# Altium footprint library JDR2812（公开）.PcbLib: 142 footprints (part 1 of 9)
Each footprint in its own frame and in the unit in brackets; x right, y up, seen from the top. Pads: shape width x height; smd on the part's side, far side on the other; paste and mask are expansions set on the pad; w line width, h text height; cw(c..) or ccw(c..) is an arc to the next point about the centre after c.
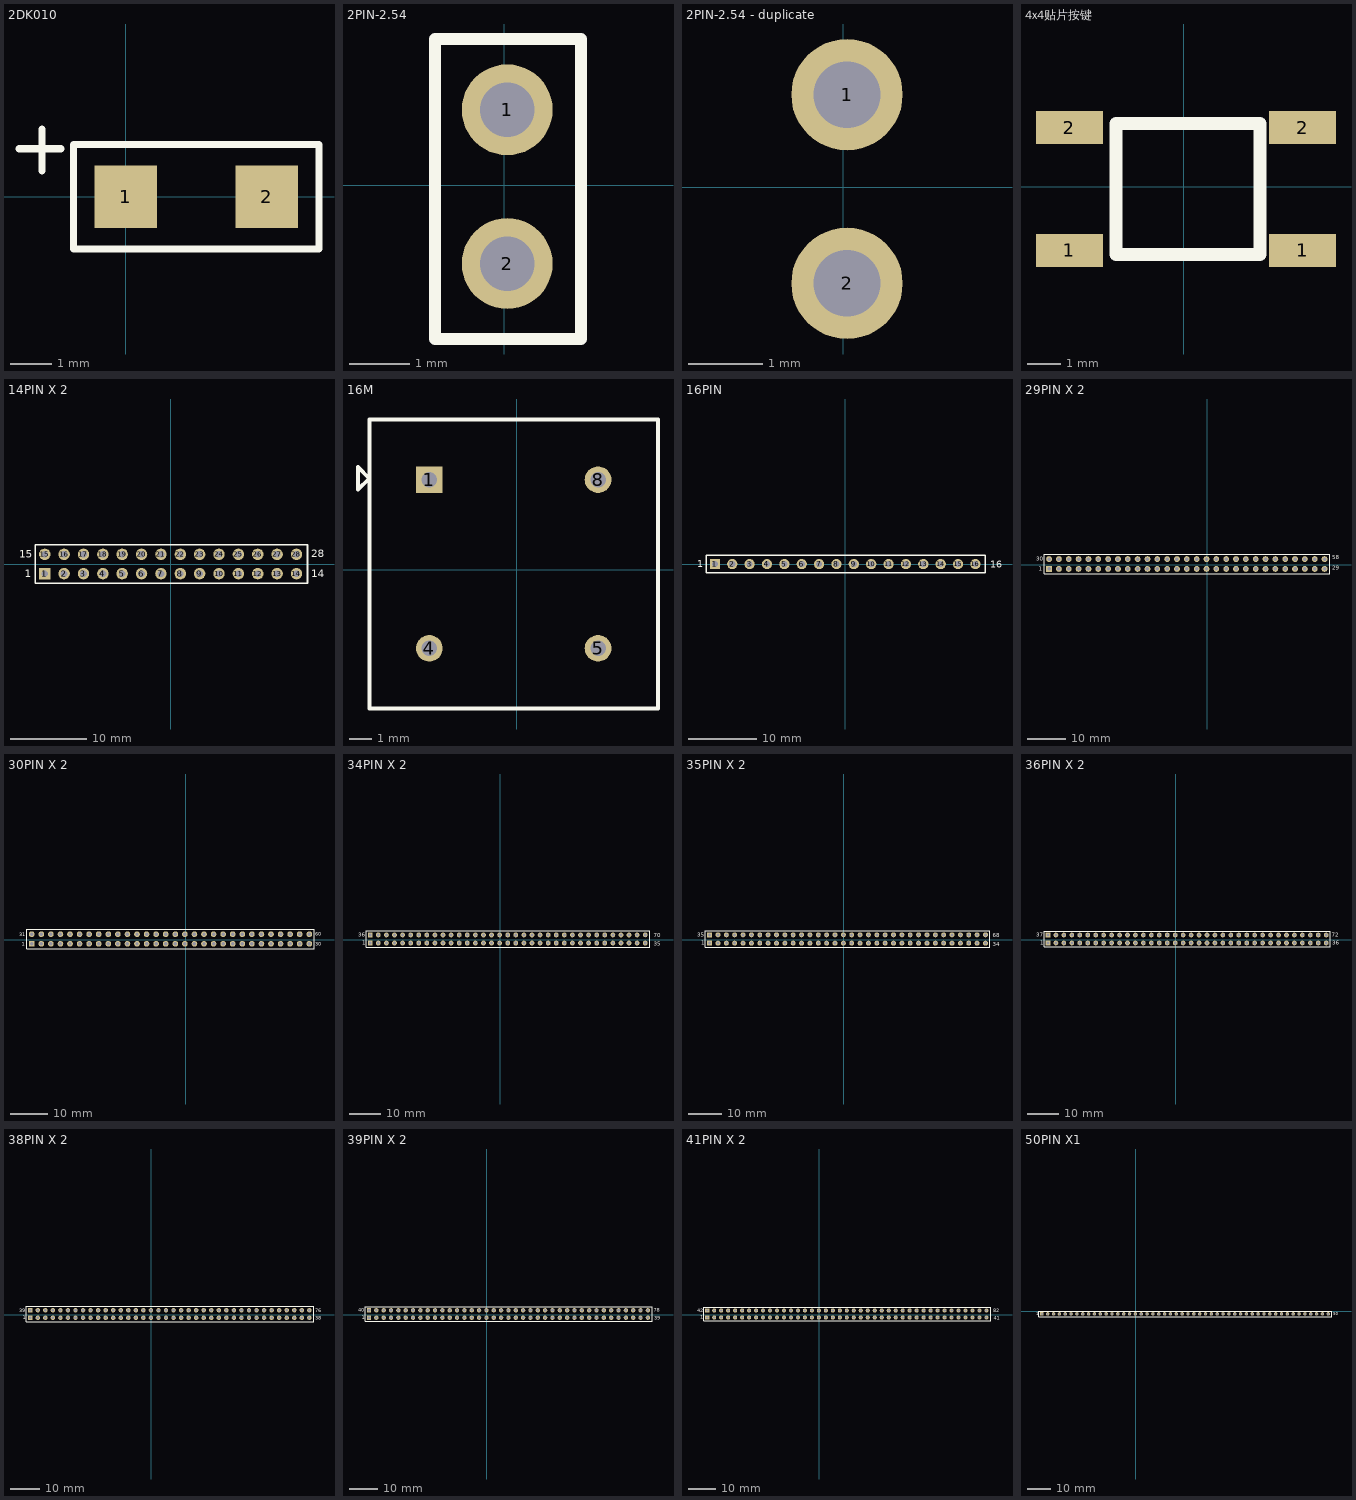
[diagram p0: the footprints below, top view; thin cyan lines are the x and y axes]

## 2DK010 [mil]
height 68.9
pads (2):
  rect 60x60 smd: 1(0,0) 2(135,0)
Top Overlay:
  lines w7: -102.12,45.83 -62.12,45.83 ; -80.12,24.83 -80.12,64.83 ; -50,-50 -50,50 185,50 185,-50 -50,-50

## 2PIN-2.54 [mm]
pads (2):
  round 1.5 hole 0.9: 1(0.051,1.245) 2(0.051,-1.295)
Top Overlay:
  lines w0.203: -1.143,-2.54 1.27,-2.54 1.27,2.413 -1.143,2.413 -1.143,-2.54

## 2PIN-2.54 - duplicate [mm]
pads (2):
  round 1.5 hole 0.9: 1(0.051,1.245) 2(0.051,-1.295)

## 4x4贴片按键 [mm]
pads (4):
  rect 2x1 smd: 1(-3.429,-1.905) 1(3.556,-1.905) 2(-3.429,1.778) 2(3.556,1.778)
Top Overlay:
  lines w0.39: -2.032,-2.032 2.286,-2.032 2.286,1.905 -2.032,1.905 -2.032,-2.032

## 14PIN X 2 [mm]
pads (28):
  rect 1.5x1.5 hole 0.9: 1(-16.51,-1.27)
  round 1.5 hole 0.9: 2(-13.97,-1.27) 3(-11.43,-1.27) 4(-8.89,-1.27) 5(-6.35,-1.27) 6(-3.81,-1.27) 7(-1.27,-1.27) 8(1.27,-1.27) 9(3.81,-1.27) 10(6.35,-1.27) 11(8.89,-1.27) 12(11.43,-1.27) 13(13.97,-1.27) 14(16.51,-1.27) 15(-16.51,1.27) 16(-13.97,1.27) 17(-11.43,1.27) 18(-8.89,1.27) 19(-6.35,1.27) 20(-3.81,1.27) 21(-1.27,1.27) 22(1.27,1.27) 23(3.81,1.27) 24(6.35,1.27) 25(8.89,1.27) 26(11.43,1.27) 27(13.97,1.27) 28(16.51,1.27)
Top Overlay:
  lines w0.2: -17.78,-2.54 17.958,-2.54 17.958,2.54 -17.78,2.54 -17.78,-2.54
  text "14" at 18.466,-1.753 h1
  text "28" at 18.466,0.914 h1
  text "15" at -19.888,0.787 h1
  text "1" at -19.126,-1.753 h1

## 16M [mm]
height 1.75
pads (4):
  rect 1.2x1.2 hole 0.7: 1(-3.927,4.054)
  round 1.2 hole 0.7: 4(-3.927,-3.546) 5(3.673,-3.546) 8(3.673,4.054)
Top Overlay:
  lines w0.178: -7.142,3.605 -7.142,4.621 -6.634,4.113 -7.142,3.605 ; -6.627,-6.246 -6.627,6.754 6.373,6.754 6.373,-6.246 -6.627,-6.246

## 16PIN [mm]
pads (16):
  rect 1.5x1.5 hole 0.9: 1(-19.05,0)
  round 1.5 hole 0.9: 2(-16.51,0) 3(-13.97,0) 4(-11.43,0) 5(-8.89,0) 6(-6.35,0) 7(-3.81,0) 8(-1.27,0) 9(1.27,0) 10(3.81,0) 11(6.35,0) 12(8.89,0) 13(11.43,0) 14(13.97,0) 15(16.51,0) 16(19.05,0)
Top Overlay:
  lines w0.2: -20.32,-1.27 -20.32,1.295 20.498,1.295 20.498,-1.27 -20.32,-1.27
  text "1" at -21.666,-0.483 h1
  text "16" at 21.209,-0.508 h1

## 29PIN X 2 [mm]
pads (58):
  rect 1.5x1.5 hole 0.9: 1(-40.818,-1.041)
  round 1.5 hole 0.9: 2(-38.278,-1.041) 3(-35.738,-1.041) 4(-33.198,-1.041) 5(-30.658,-1.041) 6(-28.118,-1.041) 7(-25.578,-1.041) 8(-23.038,-1.041) 9(-20.498,-1.041) 10(-17.958,-1.041) 11(-15.418,-1.041) 12(-12.878,-1.041) 13(-10.338,-1.041) 14(-7.798,-1.041) 15(-5.258,-1.041) 16(-2.718,-1.041) 17(-0.178,-1.041) 18(2.362,-1.041) 19(4.902,-1.041) 20(7.442,-1.041) 21(9.982,-1.041) 22(12.522,-1.041) 23(15.062,-1.041) 24(17.602,-1.041) 25(20.142,-1.041) 26(22.682,-1.041) 27(25.222,-1.041) 28(27.762,-1.041) 29(30.302,-1.041) 30(-40.818,1.499) 31(-38.278,1.499) 32(-35.738,1.499) 33(-33.198,1.499) 34(-30.658,1.499) 35(-28.118,1.499) 36(-25.578,1.499) 37(-23.038,1.499) 38(-20.498,1.499) 39(-17.958,1.499) 40(-15.418,1.499) 41(-12.878,1.499) 42(-10.338,1.499) 43(-7.798,1.499) 44(-5.258,1.499) 45(-2.718,1.499) 46(-0.178,1.499) 47(2.362,1.499) 48(4.902,1.499) 49(7.442,1.499) 50(9.982,1.499) 51(12.522,1.499) 52(15.062,1.499) 53(17.602,1.499) 54(20.142,1.499) 55(22.682,1.499) 56(25.222,1.499) 57(27.762,1.499) 58(30.302,1.499)
Top Overlay:
  lines w0.2: -42.088,-2.311 31.623,-2.311 31.623,2.769 -42.088,2.769 -42.088,-2.311
  text "29" at 32.258,-1.27 h1
  text "58" at 32.258,1.397 h1
  text "30" at -44.196,1.016 h1
  text "1" at -43.434,-1.524 h1

## 30PIN X 2 [mm]
pads (60):
  rect 1.5x1.5 hole 0.9: 1(-40.818,-1.041)
  round 1.5 hole 0.9: 2(-38.278,-1.041) 3(-35.738,-1.041) 4(-33.198,-1.041) 5(-30.658,-1.041) 6(-28.118,-1.041) 7(-25.578,-1.041) 8(-23.038,-1.041) 9(-20.498,-1.041) 10(-17.958,-1.041) 11(-15.418,-1.041) 12(-12.878,-1.041) 13(-10.338,-1.041) 14(-7.798,-1.041) 15(-5.258,-1.041) 16(-2.718,-1.041) 17(-0.178,-1.041) 18(2.362,-1.041) 19(4.902,-1.041) 20(7.442,-1.041) 21(9.982,-1.041) 22(12.522,-1.041) 23(15.062,-1.041) 24(17.602,-1.041) 25(20.142,-1.041) 26(22.682,-1.041) 27(25.222,-1.041) 28(27.762,-1.041) 29(30.302,-1.041) 30(32.842,-1.041) 31(-40.818,1.499) 32(-38.278,1.499) 33(-35.738,1.499) 34(-33.198,1.499) 35(-30.658,1.499) 36(-28.118,1.499) 37(-25.578,1.499) 38(-23.038,1.499) 39(-20.498,1.499) 40(-17.958,1.499) 41(-15.418,1.499) 42(-12.878,1.499) 43(-10.338,1.499) 44(-7.798,1.499) 45(-5.258,1.499) 46(-2.718,1.499) 47(-0.178,1.499) 48(2.362,1.499) 49(4.902,1.499) 50(7.442,1.499) 51(9.982,1.499) 52(12.522,1.499) 53(15.062,1.499) 54(17.602,1.499) 55(20.142,1.499) 56(22.682,1.499) 57(25.222,1.499) 58(27.762,1.499) 59(30.302,1.499) 60(32.842,1.499)
Top Overlay:
  lines w0.2: -42.088,-2.311 -42.088,2.769 34.163,2.769 34.163,-2.311 -42.088,-2.311
  text "1" at -43.434,-1.524 h1
  text "31" at -44.196,1.016 h1
  text "60" at 34.417,1.143 h1
  text "30" at 34.417,-1.524 h1

## 34PIN X 2 [mm]
pads (70):
  rect 1.5x1.5 hole 0.9: 1(-40.818,-1.041) 36(-40.818,1.499)
  round 1.5 hole 0.9: 2(-38.278,-1.041) 3(-35.738,-1.041) 4(-33.198,-1.041) 5(-30.658,-1.041) 6(-28.118,-1.041) 7(-25.578,-1.041) 8(-23.038,-1.041) 9(-20.498,-1.041) 10(-17.958,-1.041) 11(-15.418,-1.041) 12(-12.878,-1.041) 13(-10.338,-1.041) 14(-7.798,-1.041) 15(-5.258,-1.041) 16(-2.718,-1.041) 17(-0.178,-1.041) 18(2.362,-1.041) 19(4.902,-1.041) 20(7.442,-1.041) 21(9.982,-1.041) 22(12.522,-1.041) 23(15.062,-1.041) 24(17.602,-1.041) 25(20.142,-1.041) 26(22.682,-1.041) 27(25.222,-1.041) 28(27.762,-1.041) 29(30.302,-1.041) 30(32.842,-1.041) 31(35.382,-1.041) 32(37.922,-1.041) 33(40.462,-1.041) 34(43.002,-1.041) 35(45.568,-1.041) 37(-38.278,1.499) 38(-35.738,1.499) 39(-33.198,1.499) 40(-30.658,1.499) 41(-28.118,1.499) 42(-25.578,1.499) 43(-23.038,1.499) 44(-20.498,1.499) 45(-17.958,1.499) 46(-15.418,1.499) 47(-12.878,1.499) 48(-10.338,1.499) 49(-7.798,1.499) 50(-5.258,1.499) 51(-2.718,1.499) 52(-0.178,1.499) 53(2.362,1.499) 54(4.902,1.499) 55(7.442,1.499) 56(9.982,1.499) 57(12.522,1.499) 58(15.062,1.499) 59(17.602,1.499) 60(20.142,1.499) 61(22.682,1.499) 62(25.222,1.499) 63(27.762,1.499) 64(30.302,1.499) 65(32.842,1.499) 66(35.382,1.499) 67(37.922,1.499) 68(40.462,1.499) 69(43.002,1.499) 70(45.542,1.524)
Top Overlay:
  lines w0.2: -42.088,-2.311 -42.088,2.769 46.888,2.769 46.888,-2.311 -42.088,-2.311
  text "36" at -44.653,0.889 h1.27
  text "1" at -43.358,-1.549 h1.27
  text "70" at 48.235,0.762 h1.27
  text "35" at 48.285,-1.905 h1.27

## 35PIN X 2 [mm]
pads (68):
  rect 1.5x1.5 hole 0.9: 1(-40.818,-1.041) 35(-40.818,1.499)
  round 1.5 hole 0.9: 2(-38.278,-1.041) 3(-35.738,-1.041) 4(-33.198,-1.041) 5(-30.658,-1.041) 6(-28.118,-1.041) 7(-25.578,-1.041) 8(-23.038,-1.041) 9(-20.498,-1.041) 10(-17.958,-1.041) 11(-15.418,-1.041) 12(-12.878,-1.041) 13(-10.338,-1.041) 14(-7.798,-1.041) 15(-5.258,-1.041) 16(-2.718,-1.041) 17(-0.178,-1.041) 18(2.362,-1.041) 19(4.902,-1.041) 20(7.442,-1.041) 21(9.982,-1.041) 22(12.522,-1.041) 23(15.062,-1.041) 24(17.602,-1.041) 25(20.142,-1.041) 26(22.682,-1.041) 27(25.222,-1.041) 28(27.762,-1.041) 29(30.302,-1.041) 30(32.842,-1.041) 31(35.382,-1.041) 32(37.922,-1.041) 33(40.462,-1.041) 34(43.002,-1.041) 36(-38.278,1.499) 37(-35.738,1.499) 38(-33.198,1.499) 39(-30.658,1.499) 40(-28.118,1.499) 41(-25.578,1.499) 42(-23.038,1.499) 43(-20.498,1.499) 44(-17.958,1.499) 45(-15.418,1.499) 46(-12.878,1.499) 47(-10.338,1.499) 48(-7.798,1.499) 49(-5.258,1.499) 50(-2.718,1.499) 51(-0.178,1.499) 52(2.362,1.499) 53(4.902,1.499) 54(7.442,1.499) 55(9.982,1.499) 56(12.522,1.499) 57(15.062,1.499) 58(17.602,1.499) 59(20.142,1.499) 60(22.682,1.499) 61(25.222,1.499) 62(27.762,1.499) 63(30.302,1.499) 64(32.842,1.499) 65(35.382,1.499) 66(37.922,1.499) 67(40.462,1.499) 68(43.002,1.499)
Top Overlay:
  lines w0.2: -42.088,-2.311 -42.088,2.769 44.348,2.769 44.348,-2.311 -42.088,-2.311
  text "35" at -44.653,0.889 h1.27
  text "1" at -43.358,-1.549 h1.27
  text "68" at 45.187,0.762 h1.27
  text "34" at 45.237,-1.905 h1.27

## 36PIN X 2 [mm]
pads (72):
  rect 1.5x1.5 hole 0.9: 1(-40.818,-1.041) 37(-40.818,1.499)
  round 1.5 hole 0.9: 2(-38.278,-1.041) 3(-35.738,-1.041) 4(-33.198,-1.041) 5(-30.658,-1.041) 6(-28.118,-1.041) 7(-25.578,-1.041) 8(-23.038,-1.041) 9(-20.498,-1.041) 10(-17.958,-1.041) 11(-15.418,-1.041) 12(-12.878,-1.041) 13(-10.338,-1.041) 14(-7.798,-1.041) 15(-5.258,-1.041) 16(-2.718,-1.041) 17(-0.178,-1.041) 18(2.362,-1.041) 19(4.902,-1.041) 20(7.442,-1.041) 21(9.982,-1.041) 22(12.522,-1.041) 23(15.062,-1.041) 24(17.602,-1.041) 25(20.142,-1.041) 26(22.682,-1.041) 27(25.222,-1.041) 28(27.762,-1.041) 29(30.302,-1.041) 30(32.842,-1.041) 31(35.382,-1.041) 32(37.922,-1.041) 33(40.462,-1.041) 34(43.002,-1.041) 35(45.542,-1.041) 36(48.082,-1.041) 38(-38.278,1.499) 39(-35.738,1.499) 40(-33.198,1.499) 41(-30.658,1.499) 42(-28.118,1.499) 43(-25.578,1.499) 44(-23.038,1.499) 45(-20.498,1.499) 46(-17.958,1.499) 47(-15.418,1.499) 48(-12.878,1.499) 49(-10.338,1.499) 50(-7.798,1.499) 51(-5.258,1.499) 52(-2.718,1.499) 53(-0.178,1.499) 54(2.362,1.499) 55(4.902,1.499) 56(7.442,1.499) 57(9.982,1.499) 58(12.522,1.499) 59(15.062,1.499) 60(17.602,1.499) 61(20.142,1.499) 62(22.682,1.499) 63(25.222,1.499) 64(27.762,1.499) 65(30.302,1.499) 66(32.842,1.499) 67(35.382,1.499) 68(37.922,1.499) 69(40.462,1.499) 70(43.002,1.499) 71(45.542,1.499) 72(48.082,1.499)
Top Overlay:
  lines w0.2: -42.088,-2.311 49.428,-2.311 49.428,2.769 -42.088,2.769 -42.088,-2.311
  text "36" at 49.936,-1.651 h1.27
  text "72" at 49.886,1.016 h1.27
  text "1" at -43.358,-1.549 h1.27
  text "37" at -44.653,0.889 h1.27

## 38PIN X 2 [mm]
pads (76):
  rect 1.5x1.5 hole 0.9: 1(-40.818,-1.041) 39(-40.818,1.499)
  round 1.5 hole 0.9: 2(-38.278,-1.041) 3(-35.738,-1.041) 4(-33.198,-1.041) 5(-30.658,-1.041) 6(-28.118,-1.041) 7(-25.578,-1.041) 8(-23.038,-1.041) 9(-20.498,-1.041) 10(-17.958,-1.041) 11(-15.418,-1.041) 12(-12.878,-1.041) 13(-10.338,-1.041) 14(-7.798,-1.041) 15(-5.258,-1.041) 16(-2.718,-1.041) 17(-0.178,-1.041) 18(2.362,-1.041) 19(4.902,-1.041) 20(7.442,-1.041) 21(9.982,-1.041) 22(12.522,-1.041) 23(15.062,-1.041) 24(17.602,-1.041) 25(20.142,-1.041) 26(22.682,-1.041) 27(25.222,-1.041) 28(27.762,-1.041) 29(30.302,-1.041) 30(32.842,-1.041) 31(35.382,-1.041) 32(37.922,-1.041) 33(40.462,-1.041) 34(43.002,-1.041) 35(45.542,-1.041) 36(48.082,-1.041) 37(50.622,-1.041) 38(53.162,-1.041) 40(-38.278,1.499) 41(-35.738,1.499) 42(-33.198,1.499) 43(-30.658,1.499) 44(-28.118,1.499) 45(-25.578,1.499) 46(-23.038,1.499) 47(-20.498,1.499) 48(-17.958,1.499) 49(-15.418,1.499) 50(-12.878,1.499) 51(-10.338,1.499) 52(-7.798,1.499) 53(-5.258,1.499) 54(-2.718,1.499) 55(-0.178,1.499) 56(2.362,1.499) 57(4.902,1.499) 58(7.442,1.499) 59(9.982,1.499) 60(12.522,1.499) 61(15.062,1.499) 62(17.602,1.499) 63(20.142,1.499) 64(22.682,1.499) 65(25.222,1.499) 66(27.762,1.499) 67(30.302,1.499) 68(32.842,1.499) 69(35.382,1.499) 70(37.922,1.499) 71(40.462,1.499) 72(43.002,1.499) 73(45.542,1.499) 74(48.082,1.499) 75(50.622,1.499) 76(53.162,1.499)
Top Overlay:
  lines w0.2: -42.088,-2.311 -42.088,2.769 54.686,2.769 54.686,-2.311 -42.088,-2.311
  text "39" at -44.602,0.889 h1.27
  text "1" at -43.358,-1.549 h1.27
  text "76" at 55.067,0.889 h1.27
  text "38" at 55.143,-1.778 h1.27

## 39PIN X 2 [mm]
pads (78):
  rect 1.5x1.5 hole 0.9: 1(-40.818,-1.041) 40(-40.818,1.499)
  round 1.5 hole 0.9: 2(-38.278,-1.041) 3(-35.738,-1.041) 4(-33.198,-1.041) 5(-30.658,-1.041) 6(-28.118,-1.041) 7(-25.578,-1.041) 8(-23.038,-1.041) 9(-20.498,-1.041) 10(-17.958,-1.041) 11(-15.418,-1.041) 12(-12.878,-1.041) 13(-10.338,-1.041) 14(-7.798,-1.041) 15(-5.258,-1.041) 16(-2.718,-1.041) 17(-0.178,-1.041) 18(2.362,-1.041) 19(4.902,-1.041) 20(7.442,-1.041) 21(9.982,-1.041) 22(12.522,-1.041) 23(15.062,-1.041) 24(17.602,-1.041) 25(20.142,-1.041) 26(22.682,-1.041) 27(25.222,-1.041) 28(27.762,-1.041) 29(30.302,-1.041) 30(32.842,-1.041) 31(35.382,-1.041) 32(37.922,-1.041) 33(40.462,-1.041) 34(43.002,-1.041) 35(45.542,-1.041) 36(48.082,-1.041) 37(50.622,-1.041) 38(53.162,-1.041) 39(55.702,-1.041) 41(-38.278,1.499) 42(-35.738,1.499) 43(-33.198,1.499) 44(-30.658,1.499) 45(-28.118,1.499) 46(-25.578,1.499) 47(-23.038,1.499) 48(-20.498,1.499) 49(-17.958,1.499) 50(-15.418,1.499) 51(-12.878,1.499) 52(-10.338,1.499) 53(-7.798,1.499) 54(-5.258,1.499) 55(-2.718,1.499) 56(-0.178,1.499) 57(2.362,1.499) 58(4.902,1.499) 59(7.442,1.499) 60(9.982,1.499) 61(12.522,1.499) 62(15.062,1.499) 63(17.602,1.499) 64(20.142,1.499) 65(22.682,1.499) 66(25.222,1.499) 67(27.762,1.499) 68(30.302,1.499) 69(32.842,1.499) 70(35.382,1.499) 71(37.922,1.499) 72(40.462,1.499) 73(43.002,1.499) 74(45.542,1.499) 75(48.082,1.499) 76(50.622,1.499) 77(53.162,1.499) 78(55.702,1.499)
Top Overlay:
  lines w0.2: -42.088,-2.311 57.175,-2.311 57.175,2.769 -42.088,2.769 -42.088,-2.311
  text "39" at 57.937,-1.803 h1.27
  text "78" at 57.81,0.991 h1.27
  text "1" at -43.358,-1.549 h1.27
  text "40" at -44.628,1.016 h1.27

## 41PIN X 2 [mm]
pads (82):
  rect 1.5x1.5 hole 0.9: 1(-40.818,-1.041) 42(-40.818,1.499)
  round 1.5 hole 0.9: 2(-38.278,-1.041) 3(-35.738,-1.041) 4(-33.198,-1.041) 5(-30.658,-1.041) 6(-28.118,-1.041) 7(-25.578,-1.041) 8(-23.038,-1.041) 9(-20.498,-1.041) 10(-17.958,-1.041) 11(-15.418,-1.041) 12(-12.878,-1.041) 13(-10.338,-1.041) 14(-7.798,-1.041) 15(-5.258,-1.041) 16(-2.718,-1.041) 17(-0.178,-1.041) 18(2.362,-1.041) 19(4.902,-1.041) 20(7.442,-1.041) 21(9.982,-1.041) 22(12.522,-1.041) 23(15.062,-1.041) 24(17.602,-1.041) 25(20.142,-1.041) 26(22.682,-1.041) 27(25.222,-1.041) 28(27.762,-1.041) 29(30.302,-1.041) 30(32.842,-1.041) 31(35.382,-1.041) 32(37.922,-1.041) 33(40.462,-1.041) 34(43.002,-1.041) 35(45.542,-1.041) 36(48.082,-1.041) 37(50.622,-1.041) 38(53.162,-1.041) 39(55.702,-1.041) 40(58.242,-1.041) 41(60.782,-1.041) 43(-38.278,1.499) 44(-35.738,1.499) 45(-33.198,1.499) 46(-30.658,1.499) 47(-28.118,1.499) 48(-25.578,1.499) 49(-23.038,1.499) 50(-20.498,1.499) 51(-17.958,1.499) 52(-15.418,1.499) 53(-12.878,1.499) 54(-10.338,1.499) 55(-7.798,1.499) 56(-5.258,1.499) 57(-2.718,1.499) 58(-0.178,1.499) 59(2.362,1.499) 60(4.902,1.499) 61(7.442,1.499) 62(9.982,1.499) 63(12.522,1.499) 64(15.062,1.499) 65(17.602,1.499) 66(20.142,1.499) 67(22.682,1.499) 68(25.222,1.499) 69(27.762,1.499) 70(30.302,1.499) 71(32.842,1.499) 72(35.382,1.499) 73(37.922,1.499) 74(40.462,1.499) 75(43.002,1.499) 76(45.542,1.499) 77(48.082,1.499) 78(50.622,1.499) 79(53.162,1.499) 80(55.702,1.499) 81(58.242,1.499) 82(60.782,1.499)
Top Overlay:
  lines w0.2: -42.088,-2.311 62.408,-2.311 62.408,2.769 -42.088,2.769 -42.088,-2.311
  text "41" at 63.348,-1.778 h1.27
  text "82" at 63.17,0.889 h1.27
  text "1" at -43.358,-1.549 h1.27
  text "42" at -44.526,0.889 h1.27

## 50PIN X1 [mm]
pads (50):
  rect 1.5x1.5 hole 0.9: 1(-40.818,-1.041)
  round 1.5 hole 0.9: 2(-38.278,-1.041) 3(-35.738,-1.041) 4(-33.198,-1.041) 5(-30.658,-1.041) 6(-28.118,-1.041) 7(-25.578,-1.041) 8(-23.038,-1.041) 9(-20.498,-1.041) 10(-17.958,-1.041) 11(-15.418,-1.041) 12(-12.878,-1.041) 13(-10.338,-1.041) 14(-7.798,-1.041) 15(-5.258,-1.041) 16(-2.718,-1.041) 17(-0.178,-1.041) 18(2.362,-1.041) 19(4.902,-1.041) 20(7.442,-1.041) 21(9.982,-1.041) 22(12.522,-1.041) 23(15.062,-1.041) 24(17.602,-1.041) 25(20.142,-1.041) 26(22.682,-1.041) 27(25.222,-1.041) 28(27.762,-1.041) 29(30.302,-1.041) 30(32.842,-1.041) 31(35.382,-1.041) 32(37.922,-1.041) 33(40.462,-1.041) 34(43.002,-1.041) 35(45.542,-1.041) 36(48.082,-1.041) 37(50.622,-1.041) 38(53.162,-1.041) 39(55.702,-1.041) 40(58.242,-1.041) 41(60.782,-1.041) 42(63.322,-1.041) 43(65.862,-1.041) 44(68.402,-1.041) 45(70.942,-1.041) 46(73.482,-1.041) 47(76.022,-1.041) 48(78.562,-1.041) 49(81.102,-1.041) 50(83.642,-1.041)
Top Overlay:
  lines w0.2: -42.088,-2.311 85.09,-2.311 85.09,0.127 -42.088,0.127 -42.088,-2.311
  text "50" at 85.725,-1.651 h1.27
  text "1" at -43.358,-1.549 h1.27